# Altium footprint library laihi.PcbLib: 222 footprints (part 3 of 14)
Each footprint in its own frame and in the unit in brackets; x right, y up, seen from the top. Pads: shape width x height; smd on the part's side, far side on the other; paste and mask are expansions set on the pad; w line width, h text height; cw(c..) or ccw(c..) is an arc to the next point about the centre after c.
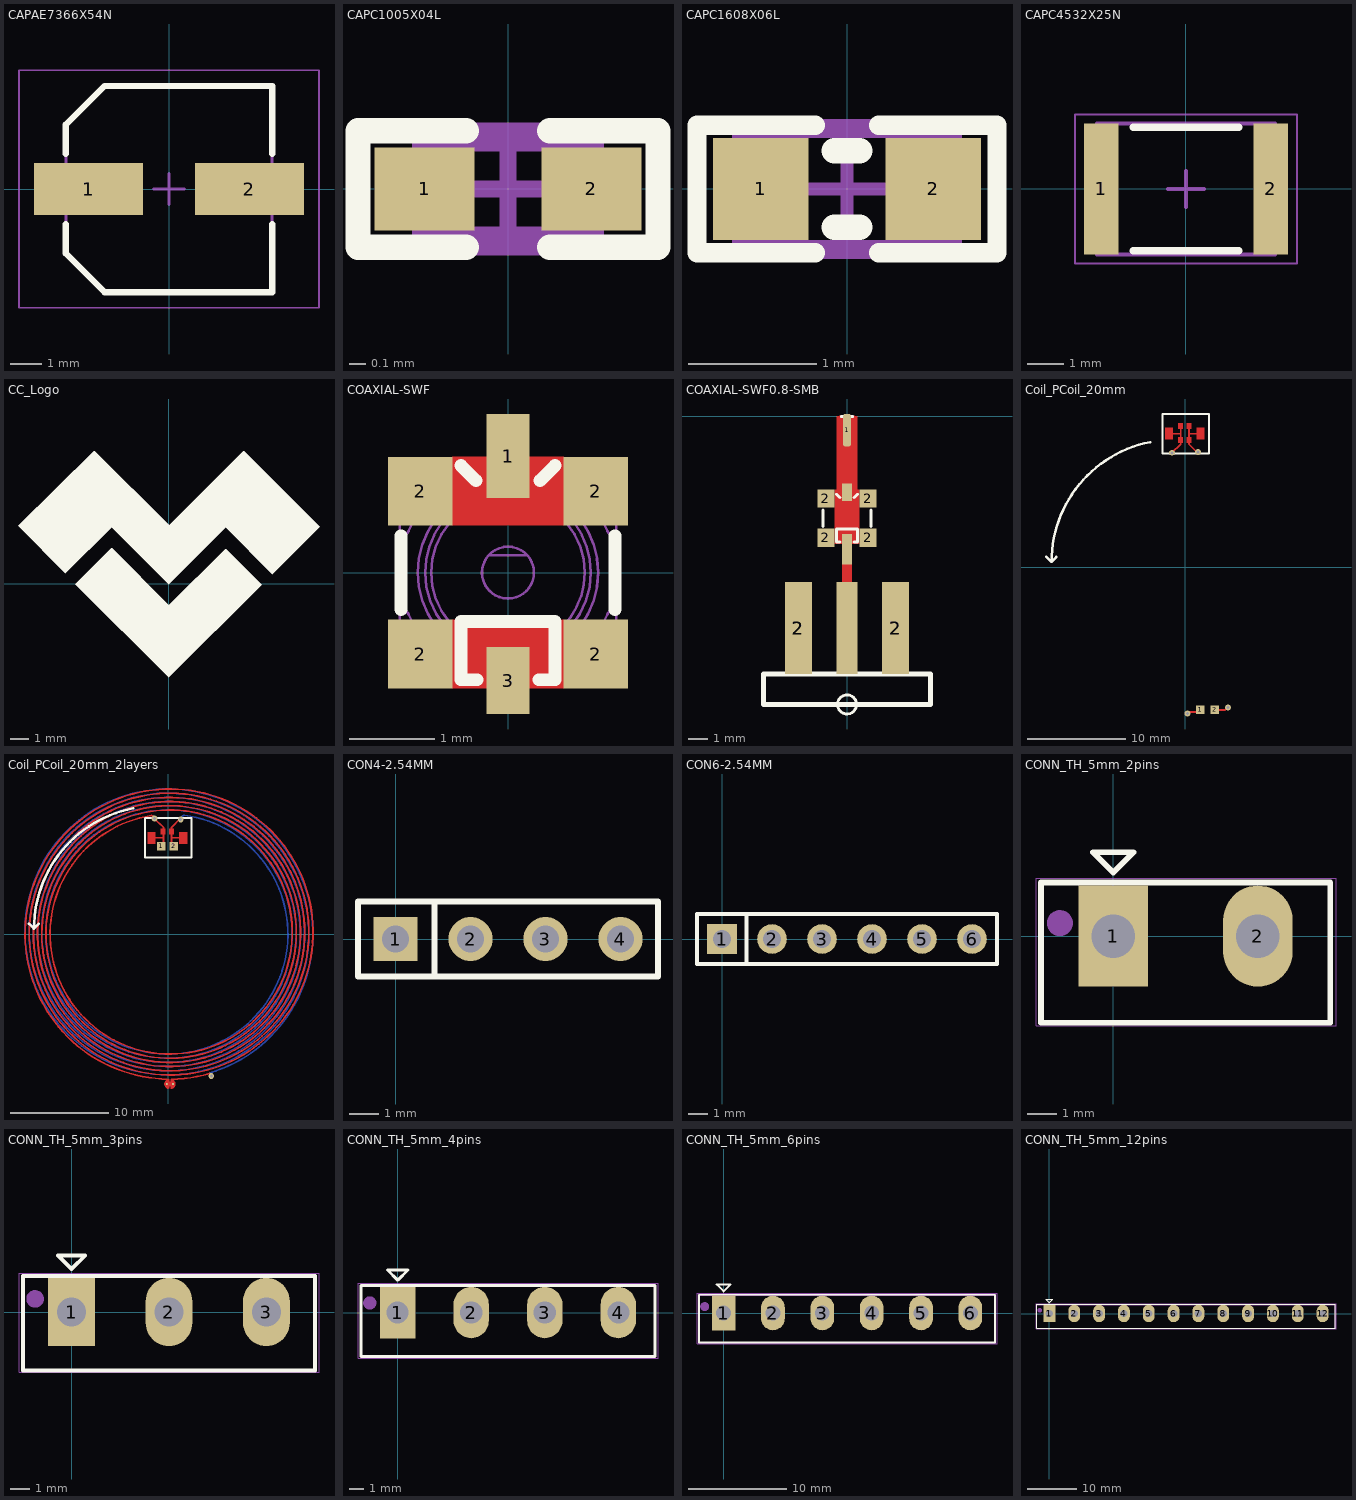
[diagram p2: the footprints below, top view; thin cyan lines are the x and y axes]

## CAPAE7366X54N [mm] "Aluminum Electrolytic Capacitor, Body 6.60x6.60x5.40mm, IPC Medium Density"
height 5.4
pads (2):
  rect 3.5x1.65 smd: 1(-2.575,0) 2(2.575,0)
Top Overlay:
  lines w0.2: -3.3,-1.125 -3.3,-2.063 -2.063,-3.3 3.3,-3.3 3.3,-1.125 ; -3.3,1.125 -3.3,2.063 -2.063,3.3 3.3,3.3 3.3,1.125
Mechanical 13:
  lines w0.1: -3.3,-2.063 -3.3,2.063 -2.063,3.3 3.3,3.3 3.3,-3.3 -2.063,-3.3 -3.3,-2.063
Mechanical 15:
  lines w0.05: -4.8,-3.8 4.8,-3.8 4.8,3.8 -4.8,3.8 -4.8,-3.8
  lines w0.1: -0.5,0 0.5,0 ; 0,-0.5 0,0.5
3D body "CAPAE7366X54N.step": height 5.4, standoff -0.9, extent -3.675,-3.3 3.675,3.3

## CAPC1005X04L [mm]
pads (2):
  rect 0.6x0.5 smd: 1(-0.5,0) 2(0.5,0)
Top Overlay:
  lines w0.152: -0.25,-0.35 -0.9,-0.35 -0.9,0.35 -0.25,0.35 ; 0.25,-0.35 0.9,-0.35 0.9,0.35 0.25,0.35
Mechanical 13:
  lines w0.1: -0.525,-0.275 0.525,-0.275 0.525,0.275 -0.525,0.275 -0.525,-0.275
Mechanical 15:
  lines w0.1: -0.275,0 0.275,0 ; 0,-0.275 0,0.275 ; -0.9,-0.35 -0.9,0.35 0.9,0.35 0.9,-0.35 -0.9,-0.35
3D body "User Library-0402(1005M) Cap.step": height 0.5, standoff -0.01, extent -0.508,-0.254 0.508,0.254

## CAPC1608X06L [mm]
pads (2):
  rect 0.75x0.8 smd: 1(-0.675,0) 2(0.675,0)
Top Overlay:
  lines w0.152: -0.25,-0.5 -1.175,-0.5 -1.175,0.5 -0.25,0.5 ; 0.25,-0.5 1.175,-0.5 1.175,0.5 0.25,0.5
  lines w0.2: -0.1,-0.3 0.1,-0.3 ; -0.1,0.3 0.1,0.3
Mechanical 13:
  lines w0.1: -0.85,-0.45 0.85,-0.45 0.85,0.45 -0.85,0.45 -0.85,-0.45
Mechanical 15:
  lines w0.1: -0.45,0 0.45,0 ; 0,-0.45 0,0.45 ; -1.175,-0.5 -1.175,0.5 1.175,0.5 1.175,-0.5 -1.175,-0.5
3D body "User Library-Chip Capacitor 0603.step": height 0.8, standoff 0, extent -0.8,-0.43 0.8,0.43

## CAPC4532X25N [mm] "Chip Capacitor C1812 size, 2-Leads, Body 4.50x3.20mm, IPC Medium Density"
height 2.5
pads (2):
  rect 0.95x3.6 smd: 1(-2.325,0) 2(2.325,0)
Top Overlay:
  lines w0.2: -1.45,-1.7 1.45,-1.7 ; -1.45,1.7 1.45,1.7
Mechanical 13:
  lines w0.1: -2.45,-1.8 -2.45,1.8 2.45,1.8 2.45,-1.8 -2.45,-1.8
Mechanical 15:
  lines w0.05: -3.05,-2.05 -3.05,2.05 3.05,2.05 3.05,-2.05 -3.05,-2.05
  lines w0.1: -0.5,0 0.5,0 ; 0,-0.5 0,0.5
3D body: height 2.5, standoff 0, extent -2.25,-1.8 2.25,1.8
3D body: height 2.5, standoff 0, extent -2.45,-1.8 -2.25,1.8
3D body: height 2.5, standoff 0, extent 2.25,-1.8 2.45,1.8

## CC_Logo [mm]
Top Overlay:
  region: -3.174,1.952 -0.003,-1.22 3.136,1.919 5.105,-0.05 -0.001,-5.156 -0.014,-5.156 -5.148,-0.022
  region: -8.295,3.201 -5.747,0.653 -5.747,0.602 -5.721,0.602 -3.163,3.16 -0.003,0 0.012,0 3.156,3.145 5.709,0.592 5.709,0.561 5.726,0.561 8.307,3.142 4.148,7.301 4.148,7.328 4.127,7.328 0.009,3.21 -4.121,7.34 -4.121,7.342
  lines w0.013: -8.295,3.201 -5.747,0.602 -3.163,3.16 0,0 3.156,3.145 5.709,0.561 8.307,3.142 4.148,7.328 0.009,3.21 -4.121,7.342 -8.295,3.201 ; -5.148,-0.022 -0.014,-5.156 5.105,-0.05 3.136,1.919 -0.003,-1.22 -3.174,1.952 -5.148,-0.022

## COAXIAL-SWF [mm]
height 1.1
pads (6):
  rect 0.5x0.98 smd: 1(0,1.36)
  rect 0.75x0.8 smd: 2(-1.025,-0.95) 2(-1.025,0.95) 2(1.025,-0.95) 2(1.025,0.95)
  rect 0.5x0.78 smd: 3(0,-1.26)
Top Layer:
  pour cut-out: -0.65,0.55 0.65,0.55 0.65,1.35 -0.65,1.35
  pour cut-out: 0.65,-0.55 -0.65,-0.55 -0.65,-1.35 0.65,-1.35
Top Overlay:
  lines w0.15: -1.25,-0.43 -1.25,0.43 ; -0.55,1.25 -0.375,1.075 ; -0.36,-1.25 -0.55,-1.25 -0.55,-0.57 0.55,-0.57 0.55,-1.25 0.36,-1.25 ; 0.375,1.075 0.55,1.25 ; 1.25,-0.43 1.25,0.43
Mechanical 7:
  drawing of 206 lines, arcs and shapes, not listed
3D body: height 0.15, standoff 0, extent -0.227,-1.301 0.227,-0.758
3D body: height 0.15, standoff 0, extent -0.227,0.899 0.227,1.299
3D body: height 0.6, standoff 0.55, extent -1.262,-1.248 1.262,1.251
3D body: height 1.4, standoff 0.6, extent -0.9,-0.9 0.9,0.901
3D body: height 0.75, standoff 0.6, extent -1.05,-1.049 1.05,1.05
3D body: height 0.95, standoff 0.75, extent -1,-0.999 1,1.001
3D body: height 0.6, standoff 0, extent 0.757,0.655 1.262,1.249
3D body: height 0.6, standoff 0, extent 0.757,-1.246 1.262,-0.653
3D body: height 0.6, standoff 0, extent -1.262,-1.25 -0.757,-0.649
3D body: height 0.6, standoff 0, extent -1.262,0.655 -0.757,1.248
3D body: height 0.55, standoff 0.1, extent -1.262,-1.252 1.262,1.253
3D body: height 0.9, standoff 0.6, extent -1.05,-1.049 1.05,1.05
3D body: height 1.25, standoff 0.95, extent -1.05,-1.049 1.05,1.05
3D body: height 1.55, standoff 1.25, extent -1.05,-1.05 1.05,1.05

## COAXIAL-SWF0.8-SMB [mm]
pads (12):
  rrect50% 0.406x1.69 smd paste-5: 1(0,-0.72)
  rect 1.4x4.8 smd: 2(-2.54,-11.075) 2(2.54,-11.075)
  rect 1.4x4.8 smd far side: 2(-2.54,-11.075) 2(2.54,-11.075)
  rect 0.9x0.95 smd: 2(-1.1,-6.35) 2(-1.1,-4.3) 2(1.1,-6.35) 2(1.1,-4.3)
  rect 1.1x4.8 smd: ""(0,-11.075)
  rect 0.5x1.58 smd: ""(0,-6.95)
  rect 0.5x0.9 smd: ""(0,-3.975)
Top Layer:
  region: -0.218,-3.538 -0.4,-3.357 -0.4,0.036 0.4,0.036 0.4,-3.37 0.232,-3.538
  pour cut-out: 0.65,-4.775 -0.65,-4.775 -0.65,-6.675 0.65,-6.675
  pour cut-out: -0.65,-4.775 0.65,-4.775 0.65,-3.835 0.533,-3.835 0.533,0 -0.533,0 -0.533,-3.835 -0.65,-3.835
  lines w0.5: 0,-11.075 0,-7.275
Top Overlay:
  circle w0.152: c0,-15.075 r0.5
  lines w0.15: -1.25,-5.755 -1.25,-4.895 ; -0.55,-4.075 -0.375,-4.25 ; -0.36,-6.575 -0.55,-6.575 -0.55,-5.895 0.55,-5.895 0.55,-6.575 0.36,-6.575 ; 0.375,-4.25 0.55,-4.075 ; 1.25,-5.755 1.25,-4.895
  lines w0.152: -0.3,0 0.3,0 ; 0,-0.275 0,0
  lines w0.254: -4.375,-15.075 4.375,-15.075 4.375,-13.475 -4.375,-13.475 -4.375,-15.075

## Coil_PCoil_20mm [mm]
pads (2):
  rect 0.85x0.85 smd: 1(1.524,-14.453) 2(3,-14.453)
via 4.318,-14.224 diameter 0.6 hole 0.3
via 1.295,11.735 diameter 0.6 hole 0.3
via -1.37,11.649 diameter 0.6 hole 0.3
via 0.229,-14.834 diameter 0.6 hole 0.3
Top Layer:
  rectangle: -2.057,12.979 -1.245,14.199
  rectangle: 1.143,12.979 1.955,14.199
  rectangle: -0.737,14.072 -0.229,14.681
  rectangle: 0.127,14.072 0.635,14.681
  rectangle: -0.737,12.649 -0.229,13.259
  rectangle: 0.127,12.649 0.635,13.259
  lines w0.152: 0.254,-14.859 cw(c0.343,-14.77) 0.254,-14.681
  lines w0.176: -1.651,13.589 -0.453,13.589 ; -1.37,11.649 -0.453,12.509 -0.453,12.92 ; 0.25,-14.683 1.417,-14.683 ; 0.369,13.589 1.549,13.589 ; 1.299,11.683 1.195,11.683 0.369,12.509 0.369,12.92 ; 3,-14.5 4.017,-14.5 4.318,-14.199 ; -0.453,12.92 -0.453,14.387 -0.453,14.376 -0.453,12.954 -0.453,12.92 ; 0.369,12.92 0.369,14.387 0.369,14.376 0.369,12.954 0.369,12.92
Mid-Layer 1:
  lines w0.152: 0.254,-14.859 cw(c0.33,-14.783) 0.254,-14.707
  lines w0.176: -3.619,14.183 ccw(c0.181,0) 0.25,-14.683 ; -3.564,14.191 cw(c0.181,0.212) 3.927,-13.767 ; -3.51,13.775 ccw(c0.181,0) 3.872,-13.774 ; -3.455,13.782 cw(c0.181,0.212) 3.817,-13.359 ; -3.4,13.367 ccw(c0.181,0) 3.763,-13.366 ; -3.346,13.374 cw(c0.181,0.212) 3.708,-12.95 ; -3.291,12.958 ccw(c0.181,0) 3.653,-12.958 ; -3.236,12.966 cw(c0.181,0.212) 3.599,-12.542 ; -3.181,12.55 ccw(c0.181,0) 3.544,-12.549 ; -3.127,12.557 cw(c0.181,0.212) 3.489,-12.134 ; -3.072,12.142 ccw(c0.181,0) 3.435,-12.141 ; -3.017,12.149 cw(c0.181,0.212) 3.38,-11.725 ; -1.408,11.687 ccw(c-1.719,11.687) -1.719,11.998 ccw(c0.181,0) 3.325,-11.733
Mid-Layer 2:
  lines w0.152: 4.216,-14.072 ccw(c4.331,-14.084) 4.318,-14.199
  lines w0.176: -3.842,14.186 cw(c-0.042,0.003) 4.204,-14.053 ; -3.787,14.194 ccw(c-0.042,0.215) 3.704,-13.764 ; -3.733,13.778 cw(c-0.042,0.003) 3.649,-13.771 ; -3.678,13.785 ccw(c-0.042,0.215) 3.594,-13.356 ; -3.623,13.37 cw(c-0.042,0.003) 3.54,-13.363 ; -3.569,13.377 ccw(c-0.042,0.215) 3.485,-12.947 ; -3.514,12.961 cw(c-0.042,0.003) 3.43,-12.955 ; -3.459,12.969 ccw(c-0.042,0.215) 3.376,-12.539 ; -3.405,12.553 cw(c-0.042,0.003) 3.321,-12.546 ; -3.35,12.56 ccw(c-0.042,0.215) 3.266,-12.131 ; -3.295,12.145 cw(c-0.042,0.003) 3.211,-12.138 ; -3.24,12.152 ccw(c-0.042,0.215) 3.157,-11.723 ; 1.338,11.721 cw(c1.649,11.721) 1.649,12.032 cw(c-0.042,0.003) 3.102,-11.73
Top Overlay:
  lines w0.2: -2.299,11.589 2.401,11.589 2.401,13.589 2.401,15.589 -2.299,15.589 -2.299,11.589
  lines w0.254: -14.108,1.058 -13.6,0.55 ; -13.092,1.058 -13.6,0.55 ; -3.569,12.739 ccw(c-1.179,0.55) -13.6,0.55

## Coil_PCoil_20mm_2layers [mm]
pads (4):
  rect 0.85x0.85 smd: 1(-0.7,8.875) 2(0.55,8.875)
  round 0.2 smd paste-10: ""(-0.15,-15.175) ""(0.475,-15.175)
via 1.257,11.601 diameter 0.6 hole 0.3
via -1.408,11.687 diameter 0.6 hole 0.3
via 4.35,-14.375 diameter 0.6 hole 0.3
Top Layer:
  rectangle: -2.096,9.137 -1.283,10.356
  rectangle: 1.104,9.137 1.917,10.356
  rectangle: -0.775,10.077 -0.267,10.686
  rectangle: 0.089,10.077 0.597,10.686
  region: 0.239,-14.743 0.315,-14.67 0.433,-14.708 0.498,-14.751 0.571,-14.824 0.625,-14.883 0.683,-14.982 0.711,-15.076 0.706,-15.297 0.681,-15.368 0.597,-15.505 0.513,-15.586 0.421,-15.644 0.32,-15.675 0.269,-15.658 0.239,-15.605
  region: 0.086,-15.607 0.01,-15.68 -0.108,-15.642 -0.173,-15.599 -0.247,-15.526 -0.3,-15.467 -0.358,-15.368 -0.386,-15.274 -0.381,-15.053 -0.356,-14.982 -0.272,-14.845 -0.188,-14.764 -0.096,-14.706 0.005,-14.675 0.056,-14.692 0.086,-14.745
  lines w0.152: 0.009,-15.606 cw(c0.12,-15.175) 0.009,-14.744 ; 0.315,-15.606 ccw(c0.205,-15.175) 0.315,-14.744 ; 4.18,-14.117 ccw(c4.392,-14.117) 4.242,-14.267
  lines w0.176: -3.619,14.183 ccw(c0.181,0) 0.01,-14.682 ; -3.564,14.191 cw(c0.181,0.212) 3.927,-13.767 ; -3.51,13.775 ccw(c0.181,0) 3.872,-13.774 ; -3.455,13.782 cw(c0.181,0.212) 3.817,-13.359 ; -3.4,13.367 ccw(c0.181,0) 3.763,-13.366 ; -3.346,13.374 cw(c0.181,0.212) 3.708,-12.95 ; -3.291,12.958 ccw(c0.181,0) 3.653,-12.958 ; -3.236,12.966 cw(c0.181,0.212) 3.599,-12.542 ; -3.181,12.55 ccw(c0.181,0) 3.544,-12.549 ; -3.127,12.557 cw(c0.181,0.212) 3.489,-12.134 ; -3.072,12.142 ccw(c0.181,0) 3.435,-12.141 ; -3.017,12.149 cw(c0.181,0.212) 3.38,-11.725 ; -1.689,9.746 -0.491,9.746 ; 0.315,-14.682 ccw(c0.144,0) 4.18,-14.117 ; 0.331,9.746 1.511,9.746 ; 1.261,11.652 1.157,11.652 0.331,10.827 0.331,10.416 ; 3.325,-11.733 cw(c0.181,0) -1.719,11.998 cw(c-1.719,11.687) -1.408,11.687 -0.491,10.827 -0.491,10.416 ; -0.491,10.416 -0.491,8.948 -0.491,8.959 -0.491,10.381 -0.491,10.416 ; 0.331,10.416 0.331,8.948 0.331,8.959 0.331,10.381 0.331,10.416
  lines w0.554: -0.15,-15.175 0.475,-15.175
Bottom Layer:
  lines w0.152: 4.204,-14.053 ccw(c4.631,-14.053) 4.329,-14.354
  lines w0.176: -3.842,14.186 cw(c-0.042,0.003) 4.204,-14.053 ; -3.787,14.194 ccw(c-0.042,0.215) 3.704,-13.764 ; -3.733,13.778 cw(c-0.042,0.003) 3.649,-13.771 ; -3.678,13.785 ccw(c-0.042,0.215) 3.594,-13.356 ; -3.623,13.37 cw(c-0.042,0.003) 3.54,-13.363 ; -3.569,13.377 ccw(c-0.042,0.215) 3.485,-12.947 ; -3.514,12.961 cw(c-0.042,0.003) 3.43,-12.955 ; -3.459,12.969 ccw(c-0.042,0.215) 3.376,-12.539 ; -3.405,12.553 cw(c-0.042,0.003) 3.321,-12.546 ; -3.35,12.56 ccw(c-0.042,0.215) 3.266,-12.131 ; -3.295,12.145 cw(c-0.042,0.003) 3.211,-12.138 ; -3.24,12.152 ccw(c-0.042,0.215) 3.157,-11.723 ; 1.338,11.721 cw(c1.649,11.721) 1.649,12.032 cw(c-0.042,0.003) 3.102,-11.73
Top Overlay:
  lines w0.2: -2.337,7.746 -2.337,11.746 2.363,11.746 2.363,9.746 2.363,7.746 -2.337,7.746
  lines w0.254: -14.108,1.058 -13.6,0.55 ; -13.092,1.058 -13.6,0.55 ; -3.569,12.739 ccw(c-1.179,0.55) -13.6,0.55
Top Paste:
  circle w0.61: c0.16,-15.175 r0.11
Top Solder:
  circle w0.61: c0.16,-15.175 r0.279

## CON4-2.54MM [mm] "Connector; Header; 6 Posi"
pads (4):
  rect 1.5x1.5 hole 0.9: 1(0,0)
  round 1.5 hole 0.9: 2(2.54,0) 3(5.08,0) 4(7.62,0)
Top Overlay:
  lines w0.2: 1.325,-1.27 1.325,1.25 ; -1.27,-1.27 -1.27,1.27 8.89,1.27 8.89,-1.27 -1.27,-1.27

## CON6-2.54MM [mm] "Connector; Header; 6 Positio"
pads (6):
  rect 1.5x1.5 hole 0.9: 1(0,0)
  round 1.5 hole 0.9: 2(2.54,0) 3(5.08,0) 4(7.62,0) 5(10.16,0) 6(12.7,0)
Top Overlay:
  lines w0.2: 1.25,-1.27 1.25,1.27 ; -1.27,-1.27 13.97,-1.27 13.97,1.27 -1.27,1.27 -1.27,-1.27

## CONN_TH_5mm_2pins [mm] "5mm Pitch Low Profile Screw terminal"
height 10
pads (2):
  rect 2.4x3.5 hole 1.5: 1(0,0)
  oval 2.4x3.5 hole 1.5: 2(5,0)
Top Overlay:
  lines w0.2: 0.7,2.9 0,2.2 -0.7,2.9 0.7,2.9 ; 0.7,2.9 0.7,2.9 ; -2.5,-3 7.5,-3 7.5,1.85 -2.5,1.85 -2.5,-3
Mechanical 13:
  circle w0.45: c-1.849,0.45 r0.224
  circle w0.025: c0,0 r0.75
  circle w0.025: c5,0 r0.75
  lines w0.025: -2.5,-3 -2.5,1.8 7.5,1.8 7.5,-3 -2.5,-3
Mechanical 15:
  lines w0.025: -2.675,-3.1 -2.675,2 7.7,2 7.7,-3.1 -2.675,-3.1
3D body: height 8.3, standoff 0, extent -2.5,-3 7.5,1.8

## CONN_TH_5mm_3pins [mm] "5mm Pitch Low Profile Screw terminal"
height 10
pads (3):
  rect 2.4x3.5 hole 1.5: 1(0,0)
  oval 2.4x3.5 hole 1.5: 2(5,0) 3(10,0)
Top Overlay:
  lines w0.2: 0.7,2.9 0,2.2 -0.7,2.9 0.7,2.9 ; 0.7,2.9 0.7,2.9 ; -2.5,-3 12.5,-3 12.5,1.85 -2.5,1.85 -2.5,-3
Mechanical 13:
  circle w0.45: c-1.874,0.675 r0.224
  circle w0.025: c10,0 r0.75
  circle w0.025: c0,0 r0.75
  circle w0.025: c5,0 r0.75
  lines w0.025: -2.5,-3 -2.5,1.8 12.5,1.8 12.5,-3 -2.5,-3
Mechanical 15:
  lines w0.025: -2.7,-3.1 -2.7,2 12.7,2 12.7,-3.1 -2.7,-3.1
3D body: height 8.3, standoff 0, extent -2.5,-3 12.5,1.8

## CONN_TH_5mm_4pins [mm] "5mm Pitch Low Profile Screw terminal"
height 10
pads (4):
  rect 2.4x3.5 hole 1.5: 1(0,0)
  oval 2.4x3.5 hole 1.5: 2(5,0) 3(10,0) 4(15,0)
Top Overlay:
  lines w0.2: 0.7,2.9 0,2.2 -0.7,2.9 0.7,2.9 ; 0.7,2.9 0.7,2.9 ; -2.5,-3 17.5,-3 17.5,1.85 -2.5,1.85 -2.5,-3
Mechanical 13:
  circle w0.45: c-1.899,0.65 r0.224
  circle w0.025: c15,0 r0.75
  circle w0.025: c10,0 r0.75
  circle w0.025: c0,0 r0.75
  circle w0.025: c5,0 r0.75
  lines w0.025: -2.5,-3 -2.5,1.8 17.5,1.8 17.5,-3 -2.5,-3
Mechanical 15:
  lines w0.025: -2.7,-3.1 -2.7,2 17.7,2 17.7,-3.1 -2.7,-3.1
3D body: height 8.3, standoff 0, extent -2.5,-3 17.5,1.8

## CONN_TH_5mm_6pins [mm] "5mm Pitch Low Profile Screw terminal"
height 10
pads (6):
  rect 2.4x3.5 hole 1.5: 1(0,0)
  oval 2.4x3.5 hole 1.5: 2(5,0) 3(10,0) 4(15,0) 5(20,0) 6(25,0)
Top Overlay:
  lines w0.2: 0.7,2.9 -0.7,2.9 0,2.2 0.7,2.9 ; 0.7,2.9 0.7,2.9 ; -2.5,-3 -2.5,1.85 27.5,1.85 27.5,-3 -2.5,-3
Mechanical 13:
  circle w0.025: c25,0 r0.75
  circle w0.025: c5,0 r0.75
  circle w0.025: c0,0 r0.75
  circle w0.025: c10,0 r0.75
  circle w0.025: c20,0 r0.75
  circle w0.025: c15,0 r0.75
  circle w0.45: c-1.924,0.65 r0.224
  lines w0.025: -2.5,-3 27.5,-3 27.5,1.8 -2.5,1.8 -2.5,-3
Mechanical 15:
  lines w0.025: -2.7,-3.1 27.7,-3.1 27.7,2 -2.7,2 -2.7,-3.1
3D body: height 8.3, standoff 0, extent -2.5,-3 27.5,1.8

## CONN_TH_5mm_12pins [mm] "5mm Pitch Low Profile Screw terminal"
height 10
pads (12):
  rect 2.4x3.5 hole 1.5: 1(0,0)
  oval 2.4x3.5 hole 1.5: 2(5,0) 3(10,0) 4(15,0) 5(20,0) 6(25,0) 7(30,0) 8(35,0) 9(40,0) 10(45,0) 11(50,0) 12(55,0)
Top Overlay:
  lines w0.2: 0.7,2.9 -0.7,2.9 0,2.2 0.7,2.9 ; 0.7,2.9 0.7,2.9 ; -2.5,-3 -2.5,1.85 57.5,1.85 57.5,-3 -2.5,-3
Mechanical 13:
  circle w0.025: c25,0 r0.75
  circle w0.025: c5,0 r0.75
  circle w0.025: c0,0 r0.75
  circle w0.025: c10,0 r0.75
  circle w0.025: c20,0 r0.75
  circle w0.025: c15,0 r0.75
  circle w0.45: c-1.924,0.65 r0.224
  circle w0.025: c40,0 r0.75
  circle w0.025: c45,0 r0.75
  circle w0.025: c35,0 r0.75
  circle w0.025: c30,0 r0.75
  circle w0.025: c50,0 r0.75
  circle w0.025: c55,0 r0.75
  lines w0.025: -2.5,-3 57.5,-3 57.5,1.8 -2.5,1.8 -2.5,-3
Mechanical 15:
  lines w0.025: -2.7,-3.1 57.7,-3.1 57.7,2 -2.7,2 -2.7,-3.1
3D body: height 8.3, standoff 0, extent -2.5,-3 57.5,1.8